# Altium footprint library PcbLib1.PcbLib: 209 footprints (part 7 of 14)
Each footprint in its own frame and in the unit in brackets; x right, y up, seen from the top. Pads: shape width x height; smd on the part's side, far side on the other; paste and mask are expansions set on the pad; w line width, h text height; cw(c..) or ccw(c..) is an arc to the next point about the centre after c.
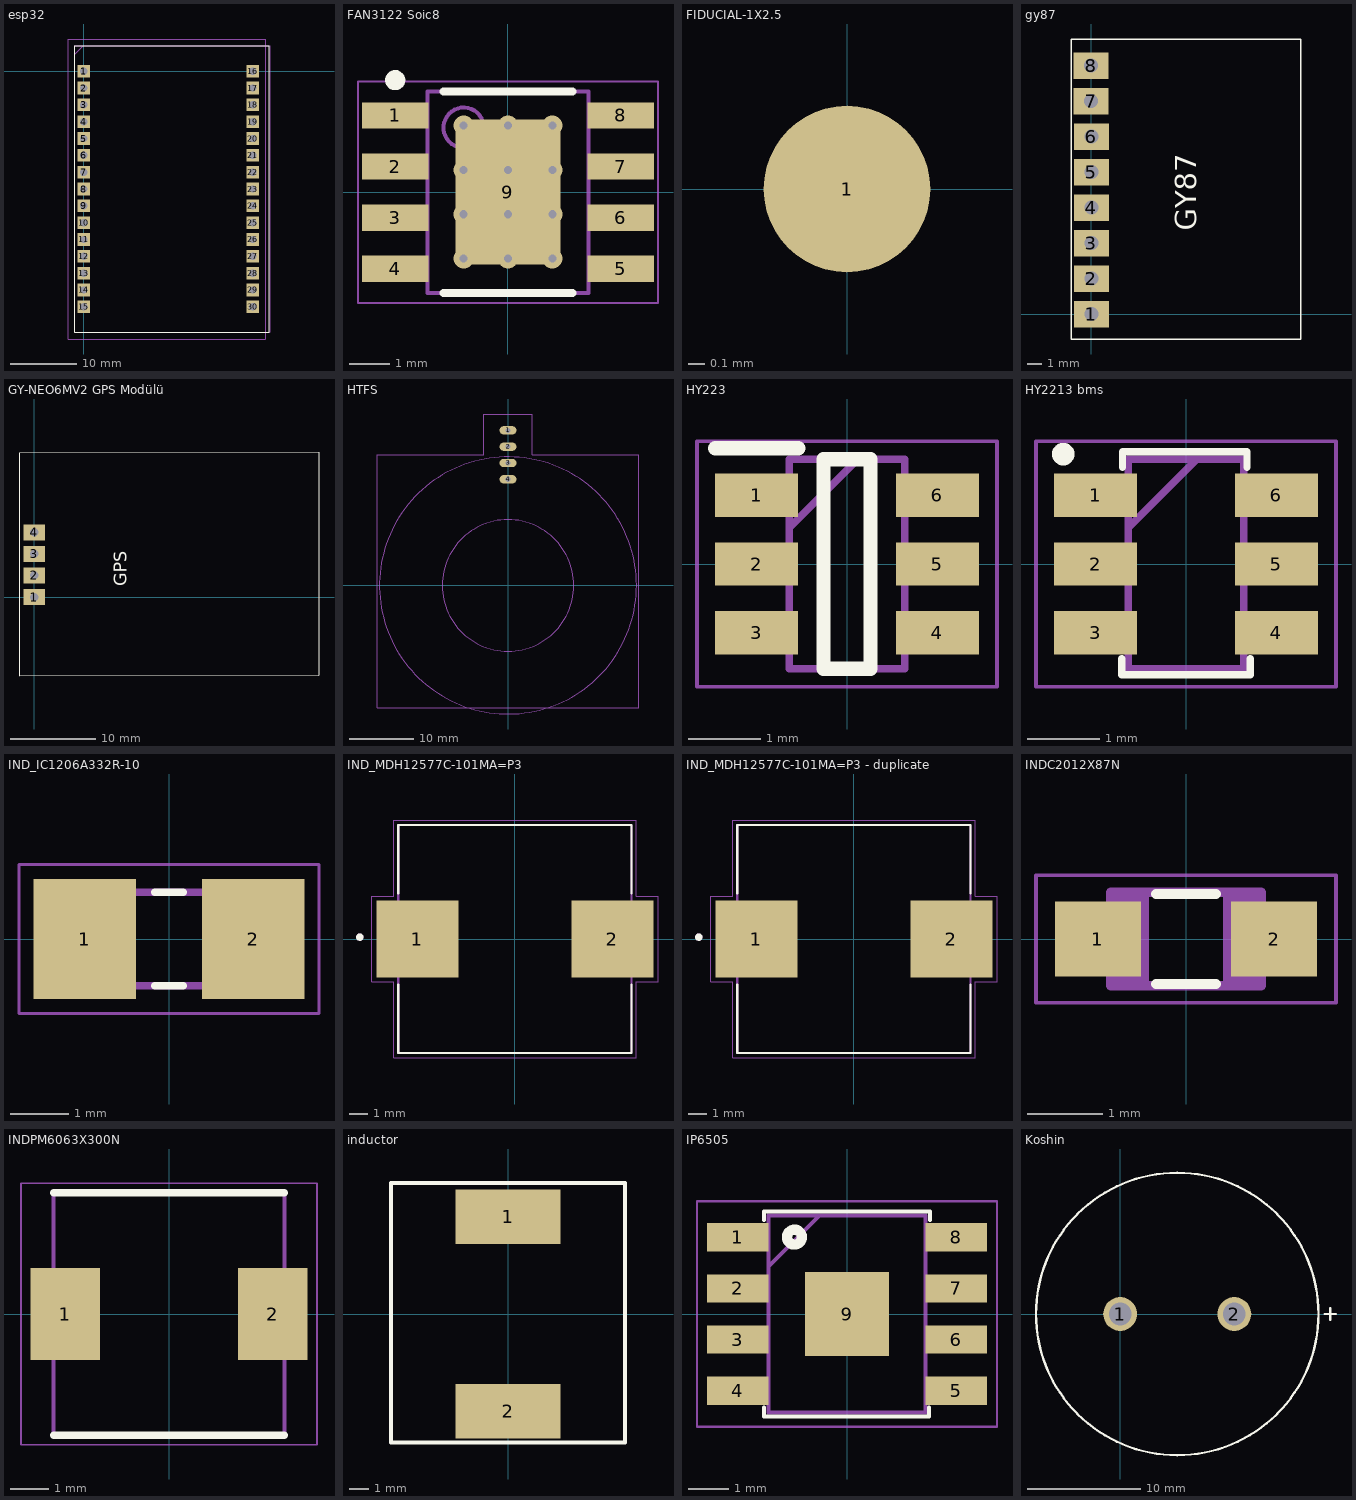
[diagram p6: the footprints below, top view; thin cyan lines are the x and y axes]

## esp32 [mm]
pads (30):
  rect 1.9x1.9 hole 1.11: 1(0,0) 2(0,-2.54) 3(0,-5.08) 4(0,-7.62) 5(0,-10.16) 6(0,-12.7) 7(0,-15.24) 8(0,-17.78) 9(0,-20.32) 10(0,-22.86) 11(0,-25.4) 12(0,-27.94) 13(0,-30.48) 14(0,-33.02) 15(0,-35.56) 16(25.5,0) 17(25.5,-2.54) 18(25.5,-5.08) 19(25.5,-7.62) 20(25.5,-10.16) 21(25.5,-12.7) 22(25.5,-15.24) 23(25.5,-17.78) 24(25.5,-20.32) 25(25.5,-22.86) 26(25.5,-25.4) 27(25.5,-27.94) 28(25.5,-30.48) 29(25.5,-33.02) 30(25.5,-35.56)
Top Overlay:
  lines w0.1: -1.32,-39.42 -1.32,3.86 27.94,3.86 27.94,-39.42 -1.32,-39.42
Mechanical 13:
  lines w0.1: -1.32,2.59 -0.05,3.86 ; -1.32,-39.42 -1.32,3.86 28.067,3.86 28.067,-39.42 -1.32,-39.42
Mechanical 15:
  lines w0.1: -2.32,-40.42 -2.32,4.86 27.432,4.86 27.432,-40.42 -2.32,-40.42
3D body "ESP-32_v1.STEP": height 6.81, standoff -5.59, extent -1.55,-41.148 26.95,9.782

## FAN3122 Soic8 [mm] "SOIC, 8-Leads, Body 4.95x3.95mm, Pitch 1.27mm, Thermal Pad 4.10x3.10mm, IPC Medium Density"
height 1.75
pads (9):
  rect 1.65x0.65 smd: 1(-2.8,1.905) 2(-2.8,0.635) 3(-2.8,-0.635) 4(-2.8,-1.905) 5(2.8,-1.905) 6(2.8,-0.635) 7(2.8,0.635) 8(2.8,1.905)
  rect 2.6x3.6 smd: 9(0,0)
via -1.1,1.65 diameter 0.5 hole 0.2
via 0,1.65 diameter 0.5 hole 0.2
via 1.1,1.65 diameter 0.5 hole 0.2
via -1.1,0.55 diameter 0.5 hole 0.2
via 0,0.55 diameter 0.5 hole 0.2
via 1.1,0.55 diameter 0.5 hole 0.2
via -1.1,-0.55 diameter 0.5 hole 0.2
via 0,-0.55 diameter 0.5 hole 0.2
via 1.1,-0.55 diameter 0.5 hole 0.2
via -1.1,-1.65 diameter 0.5 hole 0.2
via 0,-1.65 diameter 0.5 hole 0.2
via 1.1,-1.65 diameter 0.5 hole 0.2
Top Overlay:
  circle w0.25: c-2.8,2.78 r0.125
  lines w0.2: -1.6,-2.5 1.6,-2.5 ; -1.6,2.5 1.6,2.5
Top Courtyard:
  lines w0.05: -3.725,-2.75 -3.725,2.75 3.725,2.75 3.725,-2.75 -3.725,-2.75
  lines w0.1: -0.5,0 0.5,0 ; 0,-0.5 0,0.5
Top Assembly:
  circle w0.1: c-1.1,1.6 r0.5
  lines w0.1: -2,-2.5 -2,2.5 2,2.5 2,-2.5 -2,-2.5
3D body "User Library-SOIC8_JEDEC_MS-012AA.STEP": height 1.66, standoff -0.09, extent -3.124,-2.55 3.075,2.45

## FIDUCIAL-1X2.5 [mm] "FIDUCIAL-1X2.5"
pads (1):
  rrect100% 1x1 smd paste+0: 1(0,0)
Top Solder:
  circle w1.27: c0,0 r0.9

## gy87 [mm]
pads (8):
  rect 2.5x1.9 hole 1: 1(0,0) 2(0,2.54) 3(0,5.08) 4(0,7.62) 5(0,10.16) 6(0,12.7) 7(-0.016,15.24) 8(-0.016,17.78)
Top Overlay:
  lines w0.1: -1.436,-1.778 -1.436,19.177 -1.436,19.685 14.986,19.685 14.986,-1.778 0.896,-1.778 -0.106,-1.778 -1.436,-1.778
  text "GY87" at 7.493,5.969 h1.52
3D body "MPU 6050 IMU.STEP": height 6.11, standoff -5.07, extent -1.206,-1.524 14.668,19.583

## GY-NEO6MV2 GPS Modülü [mm]
pads (4):
  rect 2.5x1.9 hole 1: 1(0,0) 2(0,2.54) 3(0,5.08) 4(0,7.62)
Top Overlay:
  lines w0.1: -1.788,17.008 33.527,17.06 33.565,-9.222 -1.75,-9.273 -1.788,17.008
  text "GPS" at 10.922,1.27 h1.52
3D body "User Library-User Library-GY-GPS6MV2 v1.STEP": height 6.41, standoff -3.59, extent -1.778,-9.163 33.622,17.037

## HTFS [mil] "HTFS"
pads (4):
  oval 103x51.5 / inner round 0 / far side oval 103x51.5 hole 31.5: 1(0,950) 2(0,850) 3(0,750) 4(0,650)
Bottom 3D Body:
  circle w5: c0,0 r787.4
  circle w5: c0,0 r403.11
  lines w5: -800,-750 800,-750 800,800 150,800 150,1050 -150,1050 -150,800 -800,800 -800,-750
3D body: height 50, standoff 0, extent -51.72,924.03 51.72,975.97
3D body: height 50, standoff 0, extent -51.72,824.03 51.72,875.97
3D body: height 50, standoff 0, extent -51.72,724.03 51.72,775.97
3D body: height 50, standoff 0, extent -51.72,624.03 51.72,675.97

## HY223 [mm]
pads (6):
  rect 1.15x0.6 smd: 1(-1.25,0.95) 2(-1.25,0) 3(-1.25,-0.95) 4(1.25,-0.95) 5(1.25,0) 6(1.25,0.95)
Top Overlay:
  lines w0.2: -1.825,1.6 -0.675,1.6 ; -0.325,-1.45 0.325,-1.45 0.325,1.45 -0.325,1.45 -0.325,-1.45
Mechanical 13:
  lines w0.1: -0.8,0.5 0.15,1.45 ; -0.8,-1.45 0.8,-1.45 0.8,1.45 -0.8,1.45 -0.8,-1.45
Mechanical 15:
  lines w0.05: -2.075,-1.7 2.075,-1.7 2.075,1.7 -2.075,1.7 -2.075,-1.7
3D body "HY2213-BB3A.stp": height 1.4, standoff 0, extent -1.4,-1.45 1.4,1.45

## HY2213 bms [mm]
pads (6):
  rect 1.15x0.6 smd: 1(-1.25,0.95) 2(-1.25,0) 3(-1.25,-0.95) 4(1.25,-0.95) 5(1.25,0) 6(1.25,0.95)
Top Overlay:
  circle w0.254: c-1.699,1.52 r0.028
  lines w0.1: -0.887,-1.311 -0.887,-1.533 0.888,-1.533 0.888,-1.311 ; -0.877,1.337 -0.877,1.552 ; 0.845,1.337 0.845,1.552 -0.877,1.552 ; -0.877,1.552 -0.877,1.552
Mechanical 13:
  lines w0.1: -0.8,0.5 0.15,1.45 ; -0.8,-1.45 0.8,-1.45 0.8,1.45 -0.8,1.45 -0.8,-1.45
Mechanical 15:
  lines w0.05: -2.075,-1.7 2.075,-1.7 2.075,1.7 -2.075,1.7 -2.075,-1.7
3D body "HY2213-BB3A.stp": height 1.4, standoff 0, extent -1.4,-1.45 1.4,1.45

## IND_IC1206A332R-10 [mm]
pads (2):
  rect 1.76x2.06 smd: 1(-1.445,0) 2(1.445,0)
Top Overlay:
  lines w0.127: -0.245,-0.8 0.245,-0.8 ; -0.245,0.8 0.245,0.8
Mechanical 13:
  lines w0.127: -1.6,-0.8 1.6,-0.8 1.6,0.8 -1.6,0.8 -1.6,-0.8
Mechanical 15:
  lines w0.05: -2.575,-1.28 2.575,-1.28 2.575,1.28 -2.575,1.28 -2.575,-1.28
3D body "step_temp.STEP": height 1.4, standoff 0, extent -1.6,-0.8 1.6,0.8

## IND_MDH12577C-101MA=P3 [mm]
pads (2):
  rect 4.5x4.2 smd: 1(-5.35,0) 2(5.35,0)
Top Overlay:
  circle w0.2: c-8.505,0.1 r0.1
  lines w0.127: -6.4,-2.5 -6.4,-6.25 6.4,-6.25 6.4,-2.5 ; -6.4,2.5 -6.4,6.25 6.4,6.25 6.4,2.5
Mechanical 13:
  circle w0.2: c-8.505,0.1 r0.1
  lines w0.127: -6.4,-6.25 6.4,-6.25 6.4,6.25 -6.4,6.25 -6.4,-6.25
Mechanical 15:
  lines w0.05: -7.85,-2.35 -6.65,-2.35 -6.65,-6.5 6.65,-6.5 6.65,-2.35 7.85,-2.35 7.85,2.35 6.65,2.35 6.65,6.5 -6.65,6.5 -6.65,2.35 -7.85,2.35 -7.85,-2.35
3D body "MDH12577C-101MA=P3.STEP": height 8, standoff 0, extent -6.358,-6.278 6.442,6.222

## IND_MDH12577C-101MA=P3 - duplicate [mm]
pads (2):
  rect 4.5x4.2 smd: 1(-5.35,0) 2(5.35,0)
Top Overlay:
  circle w0.2: c-8.505,0.1 r0.1
  lines w0.127: -6.4,-2.5 -6.4,-6.25 6.4,-6.25 6.4,-2.5 ; -6.4,2.5 -6.4,6.25 6.4,6.25 6.4,2.5
Mechanical 13:
  circle w0.2: c-8.505,0.1 r0.1
  lines w0.127: -6.4,-6.25 6.4,-6.25 6.4,6.25 -6.4,6.25 -6.4,-6.25
Mechanical 15:
  lines w0.05: -7.85,-2.35 -6.65,-2.35 -6.65,-6.5 6.65,-6.5 6.65,-2.35 7.85,-2.35 7.85,2.35 6.65,2.35 6.65,6.5 -6.65,6.5 -6.65,2.35 -7.85,2.35 -7.85,-2.35
3D body "MDH12577C-101MA=P3.STEP": height 8, standoff 0, extent -6.358,-6.278 6.442,6.222

## INDC2012X87N [mm]
pads (2):
  rect 1.15x1 smd: 1(-1.175,0) 2(1.175,0)
Top Overlay:
  lines w0.127: -0.4,-0.6 0.4,-0.6 ; -0.4,0.6 0.4,0.6
Mechanical 13:
  region: -0.5,-0.625 -1,-0.625 -1,0.625 -0.5,0.625
  region: 1,-0.625 0.5,-0.625 0.5,0.625 1,0.625
  lines w0.127: -1,-0.625 1,-0.625 1,0.625 -1,0.625 -1,-0.625
Mechanical 15:
  lines w0.051: -2,-0.85 2,-0.85 2,0.85 -2,0.85 -2,-0.85
3D body "MLZ2012M100HTD25.STEP": height 1.03, standoff -0.02, extent -1,-0.625 1,0.625

## INDPM6063X300N [mm]
pads (2):
  rect 1.8x2.4 smd: 1(-2.7,0) 2(2.7,0)
Top Overlay:
  lines w0.2: -3,-3.15 3,-3.15 ; -3,3.15 3,3.15
Mechanical 13:
  lines w0.1: -3,-3.15 -3,3.15 3,3.15 3,-3.15 -3,-3.15
Mechanical 15:
  lines w0.05: -3.85,-3.4 -3.85,3.4 3.85,3.4 3.85,-3.4 -3.85,-3.4
3D body "B82462G4333M000.stp": height 3, standoff 0, extent -3,-3.15 3,3.15

## inductor [mm]
pads (2):
  rect 5.4x2.8 smd: 1(0,5) 2(0,-5)
Top Overlay:
  lines w0.2: -6.015,-6.604 -6.015,6.731 6.015,6.731 6.015,-6.604 -6.015,-6.604
3D body "User Library-DR127-1.STEP": height 8.01, standoff 0.01, extent -6.377,-6.25 6.123,6.25

## IP6505 [mm]
pads (9):
  rect 1.525x0.7 smd: 1(-2.712,1.905) 2(-2.712,0.635) 3(-2.712,-0.635) 4(-2.712,-1.905) 5(2.712,-1.905) 6(2.712,-0.635) 7(2.712,0.635) 8(2.712,1.905)
  rect 2.09x2.09 smd: 9(0,0)
Top Overlay:
  circle w0.254: c-1.305,1.908 r0.186
  lines w0.1: -2.062,2.332 -2.062,2.546 2.064,2.546 2.064,2.332 ; -2.058,-2.32 -2.058,-2.54 ; 2.034,-2.32 2.034,-2.54 -2.058,-2.54 ; -2.058,-2.54 -2.058,-2.54
Mechanical 13:
  lines w0.1: -1.95,1.18 -0.68,2.45 ; -1.95,-2.45 -1.95,2.45 1.95,2.45 1.95,-2.45 -1.95,-2.45
Mechanical 15:
  lines w0.05: -3.725,-2.8 -3.725,2.8 3.725,2.8 3.725,-2.8 -3.725,-2.8
3D body "IP6505.stp": height 1.65, standoff 0, extent -3,-2.45 3,2.45

## Koshin [mm]
pads (2):
  round 3 hole 2: 1(0,0) 2(10.1,0)
Top Overlay:
  circle w0.2: c5.05,0 r12.5
  lines w0.2: 18.082,0 19.098,0 ; 18.59,-0.508 18.59,0.508
3D body "U1-YY.step": height 49.77, standoff -5.58, extent -6.045,-11.176 15.951,10.82